# Altium integrated library Altium_WCAP-AT1H (rev20b).IntLib: 94 symbols (continued)
## 860240673003
designator C?, comment 22uF, 50V
WCAP-AT1H Aluminum Electrolytic Capacitor, Radial, THT, D6.3xH11mm, 22uF, 50V; Manufacturer Part Number: 860240673003; Manufacturer: Wurth Elektronik; Rated Voltage: 50VDC; Technical Reference: ATDD110220M050DSPA4E000; Ripple Current: 130mA; Capacitance Tolerance: +/-20%; Leakage Current: 11uA; Endurance: 5000h; Dissipation Factor: 10%; Published Date: October 2020; Operating Temperature: -40 to +105degC; Capacitance: 22uF; Packaging: Ammo Pack; Mounting Technology: THT; Height: 11mm; Diameter: 6.3mm; ComponentLink2URL: https://www.we-online.com/catalog/datasheet/860240673003.pdf; ComponentLink2Description: Datasheet; ComponentLink1URL: http://www.we-online.de; ComponentLink1Description: Manufacturer
footprint WCAP-AT1H_D6.3H11
pins: 1 P, 2 N

## 860240674004
designator C?, comment 33uF, 50V
WCAP-AT1H Aluminum Electrolytic Capacitor, Radial, THT, D8xH11.5mm, 33uF, 50V; Manufacturer Part Number: 860240674004; Manufacturer: Wurth Elektronik; Rated Voltage: 50VDC; Technical Reference: ATDE115330M050DSPA7H000; Ripple Current: 241mA; Capacitance Tolerance: +/-20%; Leakage Current: 16.5uA; Endurance: 8000h; Dissipation Factor: 10%; Published Date: October 2020; Operating Temperature: -40 to +105degC; Capacitance: 33uF; Packaging: Ammo Pack; Mounting Technology: THT; Height: 11.5mm; Diameter: 8mm; ComponentLink2URL: https://www.we-online.com/catalog/datasheet/860240674004.pdf; ComponentLink2Description: Datasheet; ComponentLink1URL: http://www.we-online.de; ComponentLink1Description: Manufacturer
footprint WCAP-AT1H_D8H11.5
pins: 1 P, 2 N

## 860240674005
designator C?, comment 47uF, 50V
WCAP-AT1H Aluminum Electrolytic Capacitor, Radial, THT, D8xH11.5mm, 47uF, 50V; Manufacturer Part Number: 860240674005; Manufacturer: Wurth Elektronik; Rated Voltage: 50VDC; Technical Reference: ATDE115470M050DSPA7H000; Ripple Current: 287mA; Capacitance Tolerance: +/-20%; Leakage Current: 23.5uA; Endurance: 8000h; Dissipation Factor: 10%; Published Date: October 2020; Operating Temperature: -40 to +105degC; Capacitance: 47uF; Packaging: Ammo Pack; Mounting Technology: THT; Height: 11.5mm; Diameter: 8mm; ComponentLink2URL: https://www.we-online.com/catalog/datasheet/860240674005.pdf; ComponentLink2Description: Datasheet; ComponentLink1URL: http://www.we-online.de; ComponentLink1Description: Manufacturer
footprint WCAP-AT1H_D8H11.5
pins: 1 P, 2 N

## 860240675006
designator C?, comment 68uF, 50V
WCAP-AT1H Aluminum Electrolytic Capacitor, Radial, THT, D10xH12.5mm, 68uF, 50V; Manufacturer Part Number: 860240675006; Manufacturer: Wurth Elektronik; Rated Voltage: 50VDC; Technical Reference: ATDF125680M050DSPA9K000; Ripple Current: 356mA; Capacitance Tolerance: +/-20%; Leakage Current: 34uA; Endurance: 10000h; Dissipation Factor: 10%; Published Date: October 2020; Operating Temperature: -40 to +105degC; Capacitance: 68uF; Packaging: Ammo Pack; Mounting Technology: THT; Height: 12.5mm; Diameter: 10mm; ComponentLink2URL: https://www.we-online.com/catalog/datasheet/860240675006.pdf; ComponentLink2Description: Datasheet; ComponentLink1URL: http://www.we-online.de; ComponentLink1Description: Manufacturer
footprint WCAP-AT1H_D10H12.5
pins: 1 P, 2 N

## 860240675007
designator C?, comment 100uF, 50V
WCAP-AT1H Aluminum Electrolytic Capacitor, Radial, THT, D10xH16mm, 100uF, 50V; Manufacturer Part Number: 860240675007; Manufacturer: Wurth Elektronik; Rated Voltage: 50VDC; Technical Reference: ATDF160101M050DSPAAK000; Ripple Current: 500mA; Capacitance Tolerance: +/-20%; Leakage Current: 50uA; Endurance: 10000h; Dissipation Factor: 10%; Published Date: October 2020; Operating Temperature: -40 to +105degC; Capacitance: 100uF; Packaging: Ammo Pack; Mounting Technology: THT; Height: 16mm; Diameter: 10mm; ComponentLink2URL: https://www.we-online.com/catalog/datasheet/860240675007.pdf; ComponentLink2Description: Datasheet; ComponentLink1URL: http://www.we-online.de; ComponentLink1Description: Manufacturer
footprint WCAP-AT1H_D10H16
pins: 1 P, 2 N

## 860240675008
designator C?, comment 150uF, 50V
WCAP-AT1H Aluminum Electrolytic Capacitor, Radial, THT, D10xH20mm, 150uF, 50V; Manufacturer Part Number: 860240675008; Manufacturer: Wurth Elektronik; Rated Voltage: 50VDC; Technical Reference: ATDF200151M050DSPAAK000; Ripple Current: 747mA; Capacitance Tolerance: +/-20%; Leakage Current: 75uA; Endurance: 10000h; Dissipation Factor: 10%; Published Date: October 2020; Operating Temperature: -40 to +105degC; Capacitance: 150uF; Packaging: Ammo Pack; Mounting Technology: THT; Height: 20mm; Diameter: 10mm; ComponentLink2URL: https://www.we-online.com/catalog/datasheet/860240675008.pdf; ComponentLink2Description: Datasheet; ComponentLink1URL: http://www.we-online.de; ComponentLink1Description: Manufacturer
footprint WCAP-AT1H_D10H20
pins: 1 P, 2 N

## 860240678009
designator C?, comment 220uF, 50V
WCAP-AT1H Aluminum Electrolytic Capacitor, Radial, THT, D13xH20mm, 220uF, 50V; Manufacturer Part Number: 860240678009; Manufacturer: Wurth Elektronik; Rated Voltage: 50VDC; Technical Reference: ATDI200221M050DSPACK000; Ripple Current: 977mA; Capacitance Tolerance: +/-20%; Leakage Current: 110uA; Endurance: 10000h; Dissipation Factor: 10%; Published Date: October 2020; Operating Temperature: -40 to +105degC; Capacitance: 220uF; Packaging: Ammo Pack; Mounting Technology: THT; Height: 20mm; Diameter: 13mm; ComponentLink2URL: https://www.we-online.com/catalog/datasheet/860240678009.pdf; ComponentLink2Description: Datasheet; ComponentLink1URL: http://www.we-online.de; ComponentLink1Description: Manufacturer
footprint WCAP-AT1H_D13H20
pins: 1 P, 2 N

## 860240678010
designator C?, comment 330uF, 50V
WCAP-AT1H Aluminum Electrolytic Capacitor, Radial, THT, D13xH25mm, 330uF, 50V; Manufacturer Part Number: 860240678010; Manufacturer: Wurth Elektronik; Rated Voltage: 50VDC; Technical Reference: ATDI250331M050DSPACK000; Ripple Current: 1150mA; Capacitance Tolerance: +/-20%; Leakage Current: 165uA; Endurance: 10000h; Dissipation Factor: 10%; Published Date: October 2020; Operating Temperature: -40 to +105degC; Capacitance: 330uF; Packaging: Ammo Pack; Mounting Technology: THT; Height: 25mm; Diameter: 13mm; ComponentLink2URL: https://www.we-online.com/catalog/datasheet/860240678010.pdf; ComponentLink2Description: Datasheet; ComponentLink1URL: http://www.we-online.de; ComponentLink1Description: Manufacturer
footprint WCAP-AT1H_D13H25
pins: 1 P, 2 N

## 860240680011
designator C?, comment 470uF, 50V
WCAP-AT1H Aluminum Electrolytic Capacitor, Radial, THT, D16xH25mm, 470uF, 50V; Manufacturer Part Number: 860240680011; Manufacturer: Wurth Elektronik; Rated Voltage: 50VDC; Technical Reference: ATDK250471M050DSPAEK000; Ripple Current: 1552mA; Capacitance Tolerance: +/-20%; Leakage Current: 235uA; Endurance: 10000h; Dissipation Factor: 10%; Published Date: October 2020; Operating Temperature: -40 to +105degC; Capacitance: 470uF; Packaging: Ammo Pack; Mounting Technology: THT; Height: 25mm; Diameter: 16mm; ComponentLink2URL: https://www.we-online.com/catalog/datasheet/860240680011.pdf; ComponentLink2Description: Datasheet; ComponentLink1URL: http://www.we-online.de; ComponentLink1Description: Manufacturer
footprint WCAP-AT1H_D16H25
pins: 1 P, 2 N

## 860240681012
designator C?, comment 1000uF, 50V
WCAP-AT1H Aluminum Electrolytic Capacitor, Radial, THT, D18xH31.5mm, 1000uF, 50V; Manufacturer Part Number: 860240681012; Manufacturer: Wurth Elektronik; Rated Voltage: 50VDC; Technical Reference: ATDL315102M050DSPAEK000; Ripple Current: 2093mA; Capacitance Tolerance: +/-20%; Leakage Current: 500uA; Endurance: 10000h; Dissipation Factor: 10%; Published Date: October 2020; Operating Temperature: -40 to +105degC; Capacitance: 1000uF; Packaging: Ammo Pack; Mounting Technology: THT; Height: 31.5mm; Diameter: 18mm; ComponentLink2URL: https://www.we-online.com/catalog/datasheet/860240681012.pdf; ComponentLink2Description: Datasheet; ComponentLink1URL: http://www.we-online.de; ComponentLink1Description: Manufacturer
footprint WCAP-AT1H_D18H31.5
pins: 1 P, 2 N

## 860240975001
designator C?, comment 10uF, 160V
WCAP-AT1H Aluminum Electrolytic Capacitor, Radial, THT, D10xH16mm, 10uF, 160V; Manufacturer Part Number: 860240975001; Manufacturer: Wurth Elektronik; Rated Voltage: 160VDC; Technical Reference: ATDF160100M160DSPAAK000; Ripple Current: 280mA; Capacitance Tolerance: +/-20%; Leakage Current: 164uA; Endurance: 10000h; Dissipation Factor: 15%; Published Date: October 2020; Operating Temperature: -40 to +105degC; Capacitance: 10uF; Packaging: Ammo Pack; Mounting Technology: THT; Height: 16mm; Diameter: 10mm; ComponentLink2URL: https://www.we-online.com/catalog/datasheet/860240975001.pdf; ComponentLink2Description: Datasheet; ComponentLink1URL: http://www.we-online.de; ComponentLink1Description: Manufacturer
footprint WCAP-AT1H_D10H16
pins: 1 P, 2 N

## 860240975002
designator C?, comment 22uF, 160V
WCAP-AT1H Aluminum Electrolytic Capacitor, Radial, THT, D10xH20mm, 22uF, 160V; Manufacturer Part Number: 860240975002; Manufacturer: Wurth Elektronik; Rated Voltage: 160VDC; Technical Reference: ATDF200220M160DSPAAK000; Ripple Current: 450mA; Capacitance Tolerance: +/-20%; Leakage Current: 240.8uA; Endurance: 10000h; Dissipation Factor: 15%; Published Date: October 2020; Operating Temperature: -40 to +105degC; Capacitance: 22uF; Packaging: Ammo Pack; Mounting Technology: THT; Height: 20mm; Diameter: 10mm; ComponentLink2URL: https://www.we-online.com/catalog/datasheet/860240975002.pdf; ComponentLink2Description: Datasheet; ComponentLink1URL: http://www.we-online.de; ComponentLink1Description: Manufacturer
footprint WCAP-AT1H_D10H20
pins: 1 P, 2 N

## 860240978003
designator C?, comment 33uF, 160V
WCAP-AT1H Aluminum Electrolytic Capacitor, Radial, THT, D13xH20mm, 33uF, 160V; Manufacturer Part Number: 860240978003; Manufacturer: Wurth Elektronik; Rated Voltage: 160VDC; Technical Reference: ATDI200330M160DSPACK000; Ripple Current: 610mA; Capacitance Tolerance: +/-20%; Leakage Current: 311.2uA; Endurance: 10000h; Dissipation Factor: 15%; Published Date: October 2020; Operating Temperature: -40 to +105degC; Capacitance: 33uF; Packaging: Ammo Pack; Mounting Technology: THT; Height: 20mm; Diameter: 13mm; ComponentLink2URL: https://www.we-online.com/catalog/datasheet/860240978003.pdf; ComponentLink2Description: Datasheet; ComponentLink1URL: http://www.we-online.de; ComponentLink1Description: Manufacturer
footprint WCAP-AT1H_D13H20
pins: 1 P, 2 N

## 860240978004
designator C?, comment 47uF, 160V
WCAP-AT1H Aluminum Electrolytic Capacitor, Radial, THT, D13xH20mm, 47uF, 160V; Manufacturer Part Number: 860240978004; Manufacturer: Wurth Elektronik; Rated Voltage: 160VDC; Technical Reference: ATDI200470M160DSPACK000; Ripple Current: 680mA; Capacitance Tolerance: +/-20%; Leakage Current: 400.8uA; Endurance: 10000h; Dissipation Factor: 15%; Published Date: October 2020; Operating Temperature: -40 to +105degC; Capacitance: 47uF; Packaging: Ammo Pack; Mounting Technology: THT; Height: 20mm; Diameter: 13mm; ComponentLink2URL: https://www.we-online.com/catalog/datasheet/860240978004.pdf; ComponentLink2Description: Datasheet; ComponentLink1URL: http://www.we-online.de; ComponentLink1Description: Manufacturer
footprint WCAP-AT1H_D13H20
pins: 1 P, 2 N

## 860240978005
designator C?, comment 68uF, 160V
WCAP-AT1H Aluminum Electrolytic Capacitor, Radial, THT, D13xH25mm, 68uF, 160V; Manufacturer Part Number: 860240978005; Manufacturer: Wurth Elektronik; Rated Voltage: 160VDC; Technical Reference: ATDI250680M160DSPACK000; Ripple Current: 1100mA; Capacitance Tolerance: +/-20%; Leakage Current: 535.2uA; Endurance: 10000h; Dissipation Factor: 15%; Published Date: October 2020; Operating Temperature: -40 to +105degC; Capacitance: 68uF; Packaging: Ammo Pack; Mounting Technology: THT; Height: 25mm; Diameter: 13mm; ComponentLink2URL: https://www.we-online.com/catalog/datasheet/860240978005.pdf; ComponentLink2Description: Datasheet; ComponentLink1URL: http://www.we-online.de; ComponentLink1Description: Manufacturer
footprint WCAP-AT1H_D13H25
pins: 1 P, 2 N

## 860240981006
designator C?, comment 100uF, 160V
WCAP-AT1H Aluminum Electrolytic Capacitor, Radial, THT, D18xH21mm, 100uF, 160V; Manufacturer Part Number: 860240981006; Manufacturer: Wurth Elektronik; Rated Voltage: 160VDC; Technical Reference: ATDL210101M160DSPAEK000; Ripple Current: 1310mA; Capacitance Tolerance: +/-20%; Leakage Current: 740uA; Endurance: 10000h; Dissipation Factor: 15%; Published Date: October 2020; Operating Temperature: -40 to +105degC; Capacitance: 100uF; Packaging: Ammo Pack; Mounting Technology: THT; Height: 21mm; Diameter: 18mm; ComponentLink2URL: https://www.we-online.com/catalog/datasheet/860240981006.pdf; ComponentLink2Description: Datasheet; ComponentLink1URL: http://www.we-online.de; ComponentLink1Description: Manufacturer
footprint WCAP-AT1H_D18H21
pins: 1 P, 2 N

## 860240981007
designator C?, comment 150uF, 160V
WCAP-AT1H Aluminum Electrolytic Capacitor, Radial, THT, D18xH25mm, 150uF, 160V; Manufacturer Part Number: 860240981007; Manufacturer: Wurth Elektronik; Rated Voltage: 160VDC; Technical Reference: ATDL250151M160DSPAEK000; Ripple Current: 1780mA; Capacitance Tolerance: +/-20%; Leakage Current: 1060uA; Endurance: 10000h; Dissipation Factor: 15%; Published Date: October 2020; Operating Temperature: -40 to +105degC; Capacitance: 150uF; Packaging: Ammo Pack; Mounting Technology: THT; Height: 25mm; Diameter: 18mm; ComponentLink2URL: https://www.we-online.com/catalog/datasheet/860240981007.pdf; ComponentLink2Description: Datasheet; ComponentLink1URL: http://www.we-online.de; ComponentLink1Description: Manufacturer
footprint WCAP-AT1H_D18H25
pins: 1 P, 2 N

## 860240981008
designator C?, comment 220uF, 160V
WCAP-AT1H Aluminum Electrolytic Capacitor, Radial, THT, D18xH25mm, 220uF, 160V; Manufacturer Part Number: 860240981008; Manufacturer: Wurth Elektronik; Rated Voltage: 160VDC; Technical Reference: ATDL250221M160DSPAEK000; Ripple Current: 2290mA; Capacitance Tolerance: +/-20%; Leakage Current: 1508uA; Endurance: 10000h; Dissipation Factor: 15%; Published Date: October 2020; Operating Temperature: -40 to +105degC; Capacitance: 220uF; Packaging: Ammo Pack; Mounting Technology: THT; Height: 25mm; Diameter: 18mm; ComponentLink2URL: https://www.we-online.com/catalog/datasheet/860240981008.pdf; ComponentLink2Description: Datasheet; ComponentLink1URL: http://www.we-online.de; ComponentLink1Description: Manufacturer
footprint WCAP-AT1H_D18H25
pins: 1 P, 2 N

## 860241075003
designator C?, comment 10uF, 200V
WCAP-AT1H Aluminum Electrolytic Capacitor, Radial, THT, D10xH20mm, 10uF, 200V; Manufacturer Part Number: 860241075003; Manufacturer: Wurth Elektronik; Rated Voltage: 200VDC; Technical Reference: ATDF200100M200DSPAAK000; Ripple Current: 310mA; Capacitance Tolerance: +/-20%; Leakage Current: 180uA; Endurance: 10000h; Dissipation Factor: 15%; Published Date: October 2020; Operating Temperature: -40 to +105degC; Capacitance: 10uF; Packaging: Ammo Pack; Mounting Technology: THT; Height: 20mm; Diameter: 10mm; ComponentLink2URL: https://www.we-online.com/catalog/datasheet/860241075003.pdf; ComponentLink2Description: Datasheet; ComponentLink1URL: http://www.we-online.de; ComponentLink1Description: Manufacturer
footprint WCAP-AT1H_D10H20
pins: 1 P, 2 N

## 860241075004
designator C?, comment 22uF, 200V
WCAP-AT1H Aluminum Electrolytic Capacitor, Radial, THT, D10xH20mm, 22uF, 200V; Manufacturer Part Number: 860241075004; Manufacturer: Wurth Elektronik; Rated Voltage: 200VDC; Technical Reference: ATDF200220M200DSPAAK000; Ripple Current: 470mA; Capacitance Tolerance: +/-20%; Leakage Current: 276uA; Endurance: 10000h; Dissipation Factor: 15%; Published Date: October 2020; Operating Temperature: -40 to +105degC; Capacitance: 22uF; Packaging: Ammo Pack; Mounting Technology: THT; Height: 20mm; Diameter: 10mm; ComponentLink2URL: https://www.we-online.com/catalog/datasheet/860241075004.pdf; ComponentLink2Description: Datasheet; ComponentLink1URL: http://www.we-online.de; ComponentLink1Description: Manufacturer
footprint WCAP-AT1H_D10H20
pins: 1 P, 2 N

## 860241078002
designator C?, comment 47uF, 200V
WCAP-AT1H Aluminum Electrolytic Capacitor, Radial, THT, D13xH20mm, 47uF, 200V; Manufacturer Part Number: 860241078002; Manufacturer: Wurth Elektronik; Rated Voltage: 200VDC; Technical Reference: ATDI200470M200DSPACK000; Ripple Current: 980mA; Capacitance Tolerance: +/-20%; Leakage Current: 476uA; Endurance: 10000h; Dissipation Factor: 15%; Published Date: October 2020; Operating Temperature: -40 to +105degC; Capacitance: 47uF; Packaging: Ammo Pack; Mounting Technology: THT; Height: 20mm; Diameter: 13mm; ComponentLink2URL: https://www.we-online.com/catalog/datasheet/860241078002.pdf; ComponentLink2Description: Datasheet; ComponentLink1URL: http://www.we-online.de; ComponentLink1Description: Manufacturer
footprint WCAP-AT1H_D13H20
pins: 1 P, 2 N

## 860241078005
designator C?, comment 33uF, 200V
WCAP-AT1H Aluminum Electrolytic Capacitor, Radial, THT, D13xH20mm, 33uF, 200V; Manufacturer Part Number: 860241078005; Manufacturer: Wurth Elektronik; Rated Voltage: 200VDC; Technical Reference: ATDI200330M200DSPACK000; Ripple Current: 620mA; Capacitance Tolerance: +/-20%; Leakage Current: 364uA; Endurance: 10000h; Dissipation Factor: 15%; Published Date: October 2020; Operating Temperature: -40 to +105degC; Capacitance: 33uF; Packaging: Ammo Pack; Mounting Technology: THT; Height: 20mm; Diameter: 13mm; ComponentLink2URL: https://www.we-online.com/catalog/datasheet/860241078005.pdf; ComponentLink2Description: Datasheet; ComponentLink1URL: http://www.we-online.de; ComponentLink1Description: Manufacturer
footprint WCAP-AT1H_D13H20
pins: 1 P, 2 N

## 860241080006
designator C?, comment 68uF, 200V
WCAP-AT1H Aluminum Electrolytic Capacitor, Radial, THT, D16xH25mm, 68uF, 200V; Manufacturer Part Number: 860241080006; Manufacturer: Wurth Elektronik; Rated Voltage: 200VDC; Technical Reference: ATDK250680M200DSPAEK000; Ripple Current: 1190mA; Capacitance Tolerance: +/-20%; Leakage Current: 644uA; Endurance: 10000h; Dissipation Factor: 15%; Published Date: October 2020; Operating Temperature: -40 to +105degC; Capacitance: 68uF; Packaging: Ammo Pack; Mounting Technology: THT; Height: 25mm; Diameter: 16mm; ComponentLink2URL: https://www.we-online.com/catalog/datasheet/860241080006.pdf; ComponentLink2Description: Datasheet; ComponentLink1URL: http://www.we-online.de; ComponentLink1Description: Manufacturer
footprint WCAP-AT1H_D16H25
pins: 1 P, 2 N

## 860241081001
designator C?, comment 330uF, 200V
WCAP-AT1H Aluminum Electrolytic Capacitor, Radial, THT, D18xH35.5mm, 330uF, 200V; Manufacturer Part Number: 860241081001; Manufacturer: Wurth Elektronik; Rated Voltage: 200VDC; Technical Reference: ATDL355331M200DSPAEK000; Ripple Current: 3220mA; Capacitance Tolerance: +/-20%; Leakage Current: 2740uA; Endurance: 10000h; Dissipation Factor: 15%; Published Date: October 2020; Operating Temperature: -40 to +105degC; Capacitance: 330uF; Packaging: Ammo Pack; Mounting Technology: THT; Height: 35.5mm; Diameter: 18mm; ComponentLink2URL: https://www.we-online.com/catalog/datasheet/860241081001.pdf; ComponentLink2Description: Datasheet; ComponentLink1URL: http://www.we-online.de; ComponentLink1Description: Manufacturer
footprint WCAP-AT1H_D18H35.5
pins: 1 P, 2 N

## 860241081007
designator C?, comment 100uF, 200V
WCAP-AT1H Aluminum Electrolytic Capacitor, Radial, THT, D18xH21mm, 100uF, 200V; Manufacturer Part Number: 860241081007; Manufacturer: Wurth Elektronik; Rated Voltage: 200VDC; Technical Reference: ATDL210101M200DSPAEK000; Ripple Current: 1380mA; Capacitance Tolerance: +/-20%; Leakage Current: 900uA; Endurance: 10000h; Dissipation Factor: 15%; Published Date: October 2020; Operating Temperature: -40 to +105degC; Capacitance: 100uF; Packaging: Ammo Pack; Mounting Technology: THT; Height: 21mm; Diameter: 18mm; ComponentLink2URL: https://www.we-online.com/catalog/datasheet/860241081007.pdf; ComponentLink2Description: Datasheet; ComponentLink1URL: http://www.we-online.de; ComponentLink1Description: Manufacturer
footprint WCAP-AT1H_D18H21
pins: 1 P, 2 N

## 860241081008
designator C?, comment 150uF, 200V
WCAP-AT1H Aluminum Electrolytic Capacitor, Radial, THT, D18xH25mm, 150uF, 200V; Manufacturer Part Number: 860241081008; Manufacturer: Wurth Elektronik; Rated Voltage: 200VDC; Technical Reference: ATDL250151M200DSPAEK000; Ripple Current: 1800mA; Capacitance Tolerance: +/-20%; Leakage Current: 1300uA; Endurance: 10000h; Dissipation Factor: 15%; Published Date: October 2020; Operating Temperature: -40 to +105degC; Capacitance: 150uF; Packaging: Ammo Pack; Mounting Technology: THT; Height: 25mm; Diameter: 18mm; ComponentLink2URL: https://www.we-online.com/catalog/datasheet/860241081008.pdf; ComponentLink2Description: Datasheet; ComponentLink1URL: http://www.we-online.de; ComponentLink1Description: Manufacturer
footprint WCAP-AT1H_D18H25
pins: 1 P, 2 N

## 860241081009
designator C?, comment 220uF, 200V
WCAP-AT1H Aluminum Electrolytic Capacitor, Radial, THT, D18xH31.5mm, 220uF, 200V; Manufacturer Part Number: 860241081009; Manufacturer: Wurth Elektronik; Rated Voltage: 200VDC; Technical Reference: ATDL315221M200DSPAEK000; Ripple Current: 2350mA; Capacitance Tolerance: +/-20%; Leakage Current: 1860uA; Endurance: 10000h; Dissipation Factor: 15%; Published Date: October 2020; Operating Temperature: -40 to +105degC; Capacitance: 220uF; Packaging: Ammo Pack; Mounting Technology: THT; Height: 31.5mm; Diameter: 18mm; ComponentLink2URL: https://www.we-online.com/catalog/datasheet/860241081009.pdf; ComponentLink2Description: Datasheet; ComponentLink1URL: http://www.we-online.de; ComponentLink1Description: Manufacturer
footprint WCAP-AT1H_D18H31.5
pins: 1 P, 2 N

## 860241175001
designator C?, comment 10uF, 250V
WCAP-AT1H Aluminum Electrolytic Capacitor, Radial, THT, D10xH20mm, 10uF, 250V; Manufacturer Part Number: 860241175001; Manufacturer: Wurth Elektronik; Rated Voltage: 250VDC; Technical Reference: ATDF200100M250DSPAAK000; Ripple Current: 320mA; Capacitance Tolerance: +/-20%; Leakage Current: 200uA; Endurance: 10000h; Dissipation Factor: 15%; Published Date: October 2020; Operating Temperature: -40 to +105degC; Capacitance: 10uF; Packaging: Ammo Pack; Mounting Technology: THT; Height: 20mm; Diameter: 10mm; ComponentLink2URL: https://www.we-online.com/catalog/datasheet/860241175001.pdf; ComponentLink2Description: Datasheet; ComponentLink1URL: http://www.we-online.de; ComponentLink1Description: Manufacturer
footprint WCAP-AT1H_D10H20
pins: 1 P, 2 N

## 860241175002
designator C?, comment 22uF, 250V
WCAP-AT1H Aluminum Electrolytic Capacitor, Radial, THT, D10xH20mm, 22uF, 250V; Manufacturer Part Number: 860241175002; Manufacturer: Wurth Elektronik; Rated Voltage: 250VDC; Technical Reference: ATDF200220M250DSPAAK000; Ripple Current: 420mA; Capacitance Tolerance: +/-20%; Leakage Current: 320uA; Endurance: 10000h; Dissipation Factor: 15%; Published Date: October 2020; Operating Temperature: -40 to +105degC; Capacitance: 22uF; Packaging: Ammo Pack; Mounting Technology: THT; Height: 20mm; Diameter: 10mm; ComponentLink2URL: https://www.we-online.com/catalog/datasheet/860241175002.pdf; ComponentLink2Description: Datasheet; ComponentLink1URL: http://www.we-online.de; ComponentLink1Description: Manufacturer
footprint WCAP-AT1H_D10H20
pins: 1 P, 2 N

## 860241178002
designator C?, comment 22uF, 250V
WCAP-AT1H Aluminum Electrolytic Capacitor, Radial, THT, D13xH20mm, 22uF, 250V; Manufacturer Part Number: 860241178002; Manufacturer: Wurth Elektronik; Rated Voltage: 250VDC; Technical Reference: ATDI200220M250DSPACK000; Ripple Current: 490mA; Capacitance Tolerance: +/-20%; Leakage Current: 320uA; Endurance: 10000h; Dissipation Factor: 15%; Published Date: October 2020; Operating Temperature: -40 to +105degC; Capacitance: 22uF; Packaging: Ammo Pack; Mounting Technology: THT; Height: 20mm; Diameter: 13mm; ComponentLink2URL: https://www.we-online.com/catalog/datasheet/860241178002.pdf; ComponentLink2Description: Datasheet; ComponentLink1URL: http://www.we-online.de; ComponentLink1Description: Manufacturer
footprint WCAP-AT1H_D13H20
pins: 1 P, 2 N

## 860241178003
designator C?, comment 33uF, 250V
WCAP-AT1H Aluminum Electrolytic Capacitor, Radial, THT, D13xH25mm, 33uF, 250V; Manufacturer Part Number: 860241178003; Manufacturer: Wurth Elektronik; Rated Voltage: 250VDC; Technical Reference: ATDI250330M250DSPACK000; Ripple Current: 750mA; Capacitance Tolerance: +/-20%; Leakage Current: 430uA; Endurance: 10000h; Dissipation Factor: 15%; Published Date: October 2020; Operating Temperature: -40 to +105degC; Capacitance: 33uF; Packaging: Ammo Pack; Mounting Technology: THT; Height: 25mm; Diameter: 13mm; ComponentLink2URL: https://www.we-online.com/catalog/datasheet/860241178003.pdf; ComponentLink2Description: Datasheet; ComponentLink1URL: http://www.we-online.de; ComponentLink1Description: Manufacturer
footprint WCAP-AT1H_D13H25
pins: 1 P, 2 N

## 860241180004
designator C?, comment 47uF, 250V
WCAP-AT1H Aluminum Electrolytic Capacitor, Radial, THT, D16xH21mm, 47uF, 250V; Manufacturer Part Number: 860241180004; Manufacturer: Wurth Elektronik; Rated Voltage: 250VDC; Technical Reference: ATDK210470M250DSPAEK000; Ripple Current: 930mA; Capacitance Tolerance: +/-20%; Leakage Current: 570uA; Endurance: 10000h; Dissipation Factor: 15%; Published Date: October 2020; Operating Temperature: -40 to +105degC; Capacitance: 47uF; Packaging: Ammo Pack; Mounting Technology: THT; Height: 21mm; Diameter: 16mm; ComponentLink2URL: https://www.we-online.com/catalog/datasheet/860241180004.pdf; ComponentLink2Description: Datasheet; ComponentLink1URL: http://www.we-online.de; ComponentLink1Description: Manufacturer
footprint WCAP-AT1H_D16H21
pins: 1 P, 2 N

## 860241181005
designator C?, comment 68uF, 250V
WCAP-AT1H Aluminum Electrolytic Capacitor, Radial, THT, D18xH21mm, 68uF, 250V; Manufacturer Part Number: 860241181005; Manufacturer: Wurth Elektronik; Rated Voltage: 250VDC; Technical Reference: ATDL210680M250DSPAEK000; Ripple Current: 1300mA; Capacitance Tolerance: +/-20%; Leakage Current: 780uA; Endurance: 10000h; Dissipation Factor: 15%; Published Date: October 2020; Operating Temperature: -40 to +105degC; Capacitance: 68uF; Packaging: Ammo Pack; Mounting Technology: THT; Height: 21mm; Diameter: 18mm; ComponentLink2URL: https://www.we-online.com/catalog/datasheet/860241181005.pdf; ComponentLink2Description: Datasheet; ComponentLink1URL: http://www.we-online.de; ComponentLink1Description: Manufacturer
footprint WCAP-AT1H_D18H21
pins: 1 P, 2 N

## 860241181006
designator C?, comment 100uF, 250V
WCAP-AT1H Aluminum Electrolytic Capacitor, Radial, THT, D18xH25mm, 100uF, 250V; Manufacturer Part Number: 860241181006; Manufacturer: Wurth Elektronik; Rated Voltage: 250VDC; Technical Reference: ATDL250101M250DSPAEK000; Ripple Current: 1500mA; Capacitance Tolerance: +/-20%; Leakage Current: 1100uA; Endurance: 10000h; Dissipation Factor: 15%; Published Date: October 2020; Operating Temperature: -40 to +105degC; Capacitance: 100uF; Packaging: Ammo Pack; Mounting Technology: THT; Height: 25mm; Diameter: 18mm; ComponentLink2URL: https://www.we-online.com/catalog/datasheet/860241181006.pdf; ComponentLink2Description: Datasheet; ComponentLink1URL: http://www.we-online.de; ComponentLink1Description: Manufacturer
footprint WCAP-AT1H_D18H25
pins: 1 P, 2 N

## 860241181007
designator C?, comment 150uF, 250V
WCAP-AT1H Aluminum Electrolytic Capacitor, Radial, THT, D18xH31.5mm, 150uF, 250V; Manufacturer Part Number: 860241181007; Manufacturer: Wurth Elektronik; Rated Voltage: 250VDC; Technical Reference: ATDL315151M250DSPAEK000; Ripple Current: 1870mA; Capacitance Tolerance: +/-20%; Leakage Current: 1600uA; Endurance: 10000h; Dissipation Factor: 15%; Published Date: October 2020; Operating Temperature: -40 to +105degC; Capacitance: 150uF; Packaging: Ammo Pack; Mounting Technology: THT; Height: 31.5mm; Diameter: 18mm; ComponentLink2URL: https://www.we-online.com/catalog/datasheet/860241181007.pdf; ComponentLink2Description: Datasheet; ComponentLink1URL: http://www.we-online.de; ComponentLink1Description: Manufacturer
footprint WCAP-AT1H_D18H31.5
pins: 1 P, 2 N

## 860241375001
designator C?, comment 6.8uF, 400V
WCAP-AT1H Aluminum Electrolytic Capacitor, Radial, THT, D10xH12.5mm, 6.8uF, 400V; Manufacturer Part Number: 860241375001; Manufacturer: Wurth Elektronik; Rated Voltage: 400VDC; Technical Reference: ATDF1256R8M400DSPA9K000; Ripple Current: 220mA; Capacitance Tolerance: +/-20%; Leakage Current: 208.8uA; Endurance: 10000h; Dissipation Factor: 20%; Published Date: October 2020; Operating Temperature: -40 to +105degC; Capacitance: 6.8uF; Packaging: Ammo Pack; Mounting Technology: THT; Height: 12.5mm; Diameter: 10mm; ComponentLink2URL: https://www.we-online.com/catalog/datasheet/860241375001.pdf; ComponentLink2Description: Datasheet; ComponentLink1URL: http://www.we-online.de; ComponentLink1Description: Manufacturer
footprint WCAP-AT1H_D10H12.5
pins: 1 P, 2 N

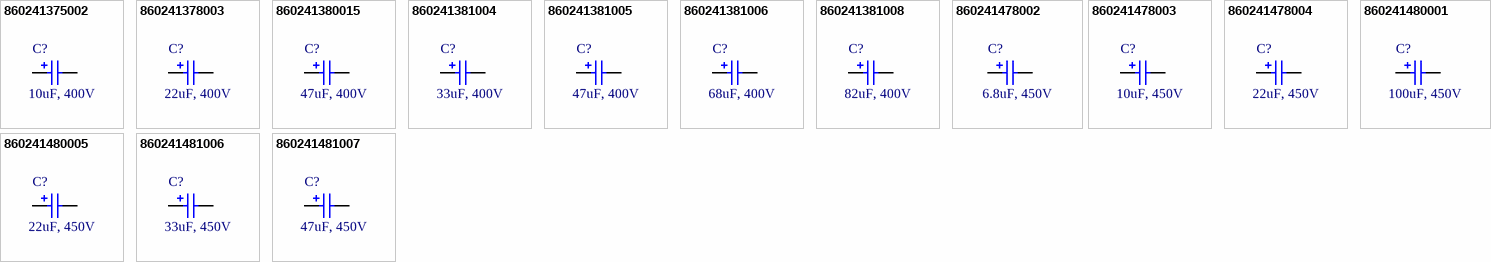
[diagram p2: symbols 860241375002 to 860241481007]

## 860241375002
designator C?, comment 10uF, 400V
WCAP-AT1H Aluminum Electrolytic Capacitor, Radial, THT, D10xH16mm, 10uF, 400V; Manufacturer Part Number: 860241375002; Manufacturer: Wurth Elektronik; Rated Voltage: 400VDC; Technical Reference: ATDF160100M400DSPAAK000; Ripple Current: 274mA; Capacitance Tolerance: +/-20%; Leakage Current: 260uA; Endurance: 10000h; Dissipation Factor: 20%; Published Date: October 2020; Operating Temperature: -40 to +105degC; Capacitance: 10uF; Packaging: Ammo Pack; Mounting Technology: THT; Height: 16mm; Diameter: 10mm; ComponentLink2URL: https://www.we-online.com/catalog/datasheet/860241375002.pdf; ComponentLink2Description: Datasheet; ComponentLink1URL: http://www.we-online.de; ComponentLink1Description: Manufacturer
footprint WCAP-AT1H_D10H16
pins: 1 P, 2 N

## 860241378003
designator C?, comment 22uF, 400V
WCAP-AT1H Aluminum Electrolytic Capacitor, Radial, THT, D13xH20mm, 22uF, 400V; Manufacturer Part Number: 860241378003; Manufacturer: Wurth Elektronik; Rated Voltage: 400VDC; Technical Reference: ATDI200220M400DSPACK000; Ripple Current: 557mA; Capacitance Tolerance: +/-20%; Leakage Current: 452uA; Endurance: 10000h; Dissipation Factor: 20%; Published Date: October 2020; Operating Temperature: -40 to +105degC; Capacitance: 22uF; Packaging: Ammo Pack; Mounting Technology: THT; Height: 20mm; Diameter: 13mm; ComponentLink2URL: https://www.we-online.com/catalog/datasheet/860241378003.pdf; ComponentLink2Description: Datasheet; ComponentLink1URL: http://www.we-online.de; ComponentLink1Description: Manufacturer
footprint WCAP-AT1H_D13H20
pins: 1 P, 2 N

## 860241380015
designator C?, comment 47uF, 400V
WCAP-AT1H Aluminum Electrolytic Capacitor, Radial, THT, D16xH25mm, 47uF, 400V; Manufacturer Part Number: 860241380015; Manufacturer: Wurth Elektronik; Rated Voltage: 400VDC; Technical Reference: ATDK250470M400DSPAEK0B0; Ripple Current: 1200mA; Capacitance Tolerance: +/-20%; Leakage Current: 852uA; Endurance: 10000h; Dissipation Factor: 20%; Published Date: October 2020; Operating Temperature: -40 to +105degC; Capacitance: 47uF; Packaging: Ammo Pack; Mounting Technology: THT; Height: 25mm; Diameter: 16mm; ComponentLink2URL: https://www.we-online.com/catalog/datasheet/860241380015.pdf; ComponentLink2Description: Datasheet; ComponentLink1URL: http://www.we-online.de; ComponentLink1Description: Manufacturer
footprint WCAP-AT1H_D16H25
pins: 1 P, 2 N

## 860241381004
designator C?, comment 33uF, 400V
WCAP-AT1H Aluminum Electrolytic Capacitor, Radial, THT, D18xH21mm, 33uF, 400V; Manufacturer Part Number: 860241381004; Manufacturer: Wurth Elektronik; Rated Voltage: 400VDC; Technical Reference: ATDL210330M400DSPAEK000; Ripple Current: 870mA; Capacitance Tolerance: +/-20%; Leakage Current: 628uA; Endurance: 10000h; Dissipation Factor: 20%; Published Date: October 2020; Operating Temperature: -40 to +105degC; Capacitance: 33uF; Packaging: Ammo Pack; Mounting Technology: THT; Height: 21mm; Diameter: 18mm; ComponentLink2URL: https://www.we-online.com/catalog/datasheet/860241381004.pdf; ComponentLink2Description: Datasheet; ComponentLink1URL: http://www.we-online.de; ComponentLink1Description: Manufacturer
footprint WCAP-AT1H_D18H21
pins: 1 P, 2 N

## 860241381005
designator C?, comment 47uF, 400V
WCAP-AT1H Aluminum Electrolytic Capacitor, Radial, THT, D18xH21mm, 47uF, 400V; Manufacturer Part Number: 860241381005; Manufacturer: Wurth Elektronik; Rated Voltage: 400VDC; Technical Reference: ATDL210470M400DSPAEK000; Ripple Current: 1050mA; Capacitance Tolerance: +/-20%; Leakage Current: 852uA; Endurance: 10000h; Dissipation Factor: 20%; Published Date: October 2020; Operating Temperature: -40 to +105degC; Capacitance: 47uF; Packaging: Ammo Pack; Mounting Technology: THT; Height: 21mm; Diameter: 18mm; ComponentLink2URL: https://www.we-online.com/catalog/datasheet/860241381005.pdf; ComponentLink2Description: Datasheet; ComponentLink1URL: http://www.we-online.de; ComponentLink1Description: Manufacturer
footprint WCAP-AT1H_D18H21
pins: 1 P, 2 N

## 860241381006
designator C?, comment 68uF, 400V
WCAP-AT1H Aluminum Electrolytic Capacitor, Radial, THT, D18xH31.5mm, 68uF, 400V; Manufacturer Part Number: 860241381006; Manufacturer: Wurth Elektronik; Rated Voltage: 400VDC; Technical Reference: ATDL315680M400DSPAEK000; Ripple Current: 1460mA; Capacitance Tolerance: +/-20%; Leakage Current: 1188uA; Endurance: 10000h; Dissipation Factor: 20%; Published Date: October 2020; Operating Temperature: -40 to +105degC; Capacitance: 68uF; Packaging: Ammo Pack; Mounting Technology: THT; Height: 31.5mm; Diameter: 18mm; ComponentLink2URL: https://www.we-online.com/catalog/datasheet/860241381006.pdf; ComponentLink2Description: Datasheet; ComponentLink1URL: http://www.we-online.de; ComponentLink1Description: Manufacturer
footprint WCAP-AT1H_D18H31.5
pins: 1 P, 2 N

## 860241381008
designator C?, comment 82uF, 400V
WCAP-AT1H Aluminum Electrolytic Capacitor, Radial, THT, D18xH25mm, 82uF, 400V; Manufacturer Part Number: 860241381008; Manufacturer: Wurth Elektronik; Rated Voltage: 400VDC; Technical Reference: ATDL250820M400DSPAEK0R1; Ripple Current: 1530mA; Capacitance Tolerance: +/-20%; Leakage Current: 1412uA; Endurance: 10000h; Dissipation Factor: 20%; Published Date: October 2020; Operating Temperature: -40 to +105degC; Capacitance: 82uF; Packaging: Ammo Pack; Mounting Technology: THT; Height: 25mm; Diameter: 18mm; ComponentLink2URL: https://www.we-online.com/catalog/datasheet/860241381008.pdf; ComponentLink2Description: Datasheet; ComponentLink1URL: http://www.we-online.de; ComponentLink1Description: Manufacturer
footprint WCAP-AT1H_D18H25
pins: 1 P, 2 N

## 860241478002
designator C?, comment 6.8uF, 450V
WCAP-AT1H Aluminum Electrolytic Capacitor, Radial, THT, D13xH20mm, 6.8uF, 450V; Manufacturer Part Number: 860241478002; Manufacturer: Wurth Elektronik; Rated Voltage: 450VDC; Technical Reference: ATJI2006R8M450DSPACK000; Ripple Current: 240mA; Capacitance Tolerance: +/-20%; Leakage Current: 222.4uA; Endurance: 10000h; Dissipation Factor: 20%; Published Date: October 2020; Operating Temperature: -25 to +105degC; Capacitance: 6.8uF; Packaging: Ammo Pack; Mounting Technology: THT; Height: 20mm; Diameter: 13mm; ComponentLink2URL: https://www.we-online.com/catalog/datasheet/860241478002.pdf; ComponentLink2Description: Datasheet; ComponentLink1URL: http://www.we-online.de; ComponentLink1Description: Manufacturer
footprint WCAP-AT1H_D13H20
pins: 1 P, 2 N

## 860241478003
designator C?, comment 10uF, 450V
WCAP-AT1H Aluminum Electrolytic Capacitor, Radial, THT, D13xH20mm, 10uF, 450V; Manufacturer Part Number: 860241478003; Manufacturer: Wurth Elektronik; Rated Voltage: 450VDC; Technical Reference: ATJI200100M450DSPACK000; Ripple Current: 390mA; Capacitance Tolerance: +/-20%; Leakage Current: 280uA; Endurance: 10000h; Dissipation Factor: 20%; Published Date: October 2020; Operating Temperature: -25 to +105degC; Capacitance: 10uF; Packaging: Ammo Pack; Mounting Technology: THT; Height: 20mm; Diameter: 13mm; ComponentLink2URL: https://www.we-online.com/catalog/datasheet/860241478003.pdf; ComponentLink2Description: Datasheet; ComponentLink1URL: http://www.we-online.de; ComponentLink1Description: Manufacturer
footprint WCAP-AT1H_D13H20
pins: 1 P, 2 N

## 860241478004
designator C?, comment 22uF, 450V
WCAP-AT1H Aluminum Electrolytic Capacitor, Radial, THT, D13xH25mm, 22uF, 450V; Manufacturer Part Number: 860241478004; Manufacturer: Wurth Elektronik; Rated Voltage: 450VDC; Technical Reference: ATJI250220M450DSPACK000; Ripple Current: 632mA; Capacitance Tolerance: +/-20%; Leakage Current: 496uA; Endurance: 10000h; Dissipation Factor: 20%; Published Date: October 2020; Operating Temperature: -25 to +105degC; Capacitance: 22uF; Packaging: Ammo Pack; Mounting Technology: THT; Height: 25mm; Diameter: 13mm; ComponentLink2URL: https://www.we-online.com/catalog/datasheet/860241478004.pdf; ComponentLink2Description: Datasheet; ComponentLink1URL: http://www.we-online.de; ComponentLink1Description: Manufacturer
footprint WCAP-AT1H_D13H25
pins: 1 P, 2 N

## 860241480001
designator C?, comment 100uF, 450V
WCAP-AT1H Aluminum Electrolytic Capacitor, Radial, THT, D16xH35.5mm, 100uF, 450V; Manufacturer Part Number: 860241480001; Manufacturer: Wurth Elektronik; Rated Voltage: 450VDC; Technical Reference: ATJK355101M450DSPADE000; Ripple Current: 610mA; Capacitance Tolerance: +/-20%; Leakage Current: 1900uA; Endurance: 5000h; Dissipation Factor: 17%; Published Date: October 2020; Operating Temperature: -25 to +105degC; Capacitance: 100uF; Packaging: Ammo Pack; Mounting Technology: THT; Height: 35.5mm; Diameter: 16mm; ComponentLink2URL: https://www.we-online.com/catalog/datasheet/860241480001.pdf; ComponentLink2Description: Datasheet; ComponentLink1URL: http://www.we-online.de; ComponentLink1Description: Manufacturer
footprint WCAP-AT1H_D16H35.5
pins: 1 P, 2 N

## 860241480005
designator C?, comment 22uF, 450V
WCAP-AT1H Aluminum Electrolytic Capacitor, Radial, THT, D16xH21mm, 22uF, 450V; Manufacturer Part Number: 860241480005; Manufacturer: Wurth Elektronik; Rated Voltage: 450VDC; Technical Reference: ATJK210220M450DSPAEK000; Ripple Current: 685mA; Capacitance Tolerance: +/-20%; Leakage Current: 496uA; Endurance: 10000h; Dissipation Factor: 20%; Published Date: October 2020; Operating Temperature: -25 to +105degC; Capacitance: 22uF; Packaging: Ammo Pack; Mounting Technology: THT; Height: 21mm; Diameter: 16mm; ComponentLink2URL: https://www.we-online.com/catalog/datasheet/860241480005.pdf; ComponentLink2Description: Datasheet; ComponentLink1URL: http://www.we-online.de; ComponentLink1Description: Manufacturer
footprint WCAP-AT1H_D16H21
pins: 1 P, 2 N

## 860241481006
designator C?, comment 33uF, 450V
WCAP-AT1H Aluminum Electrolytic Capacitor, Radial, THT, D18xH21mm, 33uF, 450V; Manufacturer Part Number: 860241481006; Manufacturer: Wurth Elektronik; Rated Voltage: 450VDC; Technical Reference: ATJL210330M450DSPAEK000; Ripple Current: 883mA; Capacitance Tolerance: +/-20%; Leakage Current: 694uA; Endurance: 10000h; Dissipation Factor: 20%; Published Date: October 2020; Operating Temperature: -25 to +105degC; Capacitance: 33uF; Packaging: Ammo Pack; Mounting Technology: THT; Height: 21mm; Diameter: 18mm; ComponentLink2URL: https://www.we-online.com/catalog/datasheet/860241481006.pdf; ComponentLink2Description: Datasheet; ComponentLink1URL: http://www.we-online.de; ComponentLink1Description: Manufacturer
footprint WCAP-AT1H_D18H21
pins: 1 P, 2 N

## 860241481007
designator C?, comment 47uF, 450V
WCAP-AT1H Aluminum Electrolytic Capacitor, Radial, THT, D18xH31.5mm, 47uF, 450V; Manufacturer Part Number: 860241481007; Manufacturer: Wurth Elektronik; Rated Voltage: 450VDC; Technical Reference: ATJL315470M450DSPAEK000; Ripple Current: 1120mA; Capacitance Tolerance: +/-20%; Leakage Current: 946uA; Endurance: 10000h; Dissipation Factor: 20%; Published Date: October 2020; Operating Temperature: -25 to +105degC; Capacitance: 47uF; Packaging: Ammo Pack; Mounting Technology: THT; Height: 31.5mm; Diameter: 18mm; ComponentLink2URL: https://www.we-online.com/catalog/datasheet/860241481007.pdf; ComponentLink2Description: Datasheet; ComponentLink1URL: http://www.we-online.de; ComponentLink1Description: Manufacturer
footprint WCAP-AT1H_D18H31.5
pins: 1 P, 2 N